# Altium footprint library SpaceVNX.PcbLib: 61 footprints (part 3 of 4)
Each footprint in its own frame and in the unit in brackets; x right, y up, seen from the top. Pads: shape width x height; smd on the part's side, far side on the other; paste and mask are expansions set on the pad; w line width, h text height; cw(c..) or ccw(c..) is an arc to the next point about the centre after c.
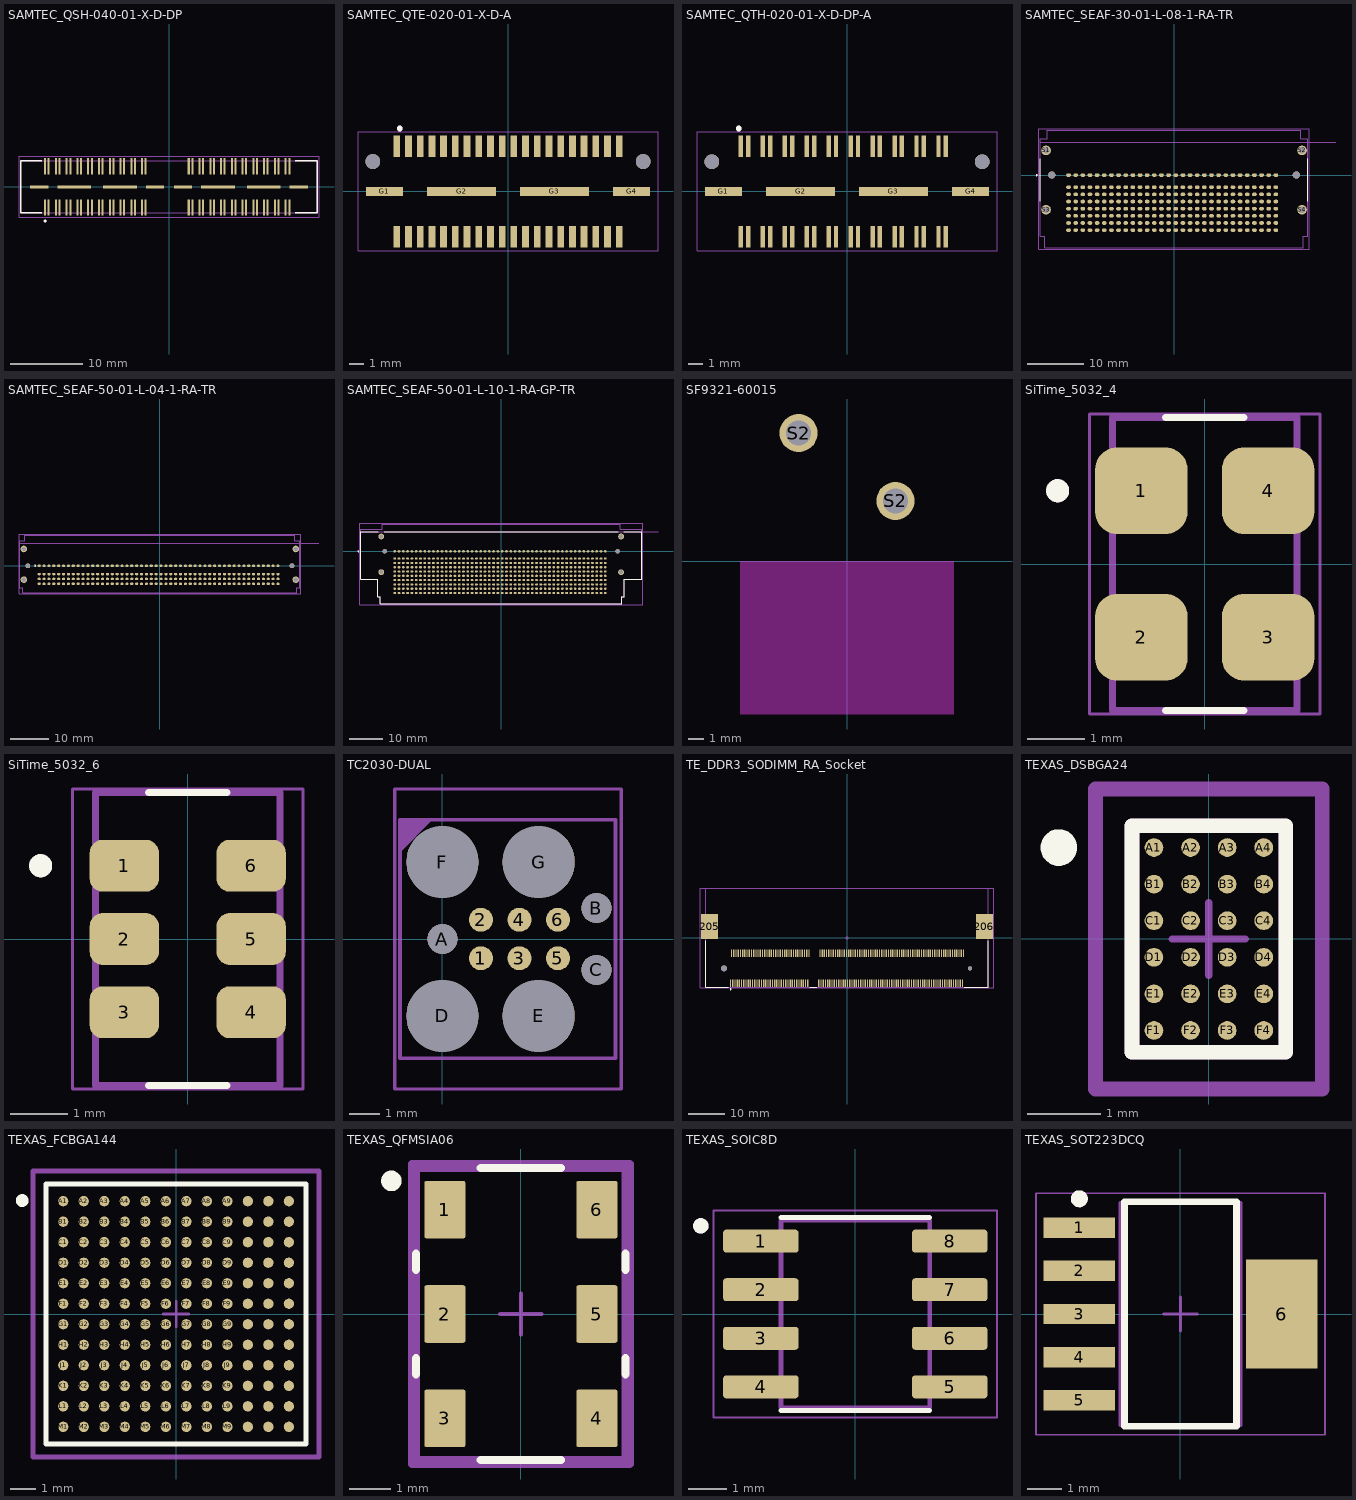
[diagram p2: the footprints below, top view; thin cyan lines are the x and y axes]

## SAMTEC_QSH-040-01-X-D-DP [mm]
pads (88):
  rect 0.28x2.27 smd: 01(-17.25,-2.87) 02(-17.25,2.87) 03(-16.75,-2.87) 04(-16.75,2.87) 05(-15.75,-2.87) 06(-15.75,2.87) 07(-15.25,-2.87) 08(-15.25,2.87) 09(-14.25,-2.87) 10(-14.25,2.87) 11(-13.75,-2.87) 12(-13.75,2.87) 13(-12.75,-2.87) 14(-12.75,2.87) 15(-12.25,-2.87) 16(-12.25,2.87) 17(-11.25,-2.87) 18(-11.25,2.87) 19(-10.75,-2.87) 20(-10.75,2.87) 21(-9.75,-2.87) 22(-9.75,2.87) 23(-9.25,-2.87) 24(-9.25,2.87) 25(-8.25,-2.87) 26(-8.25,2.87) 27(-7.75,-2.87) 28(-7.75,2.87) 29(-6.75,-2.87) 30(-6.75,2.87) 31(-6.25,-2.87) 32(-6.25,2.87) 33(-5.25,-2.87) 34(-5.25,2.87) 35(-4.75,-2.87) 36(-4.75,2.87) 37(-3.75,-2.87) 38(-3.75,2.87) 39(-3.25,-2.87) 40(-3.25,2.87) 41(2.75,-2.87) 42(2.75,2.87) 43(3.25,-2.87) 44(3.25,2.87) 45(4.25,-2.87) 46(4.25,2.87) 47(4.75,-2.87) 48(4.75,2.87) 49(5.75,-2.87) 50(5.75,2.87) 51(6.25,-2.87) 52(6.25,2.87) 53(7.25,-2.87) 54(7.25,2.87) 55(7.75,-2.87) 56(7.75,2.87) 57(8.75,-2.87) 58(8.75,2.87) 59(9.25,-2.87) 60(9.25,2.87) 61(10.25,-2.87) 62(10.25,2.87) 63(10.75,-2.87) 64(10.75,2.87) 65(11.75,-2.87) 66(11.75,2.87) 67(12.25,-2.87) 68(12.25,2.87) 69(13.25,-2.87) 70(13.25,2.87) 71(13.75,-2.87) 72(13.75,2.87) 73(14.75,-2.87) 74(14.75,2.87) 75(15.25,-2.87) 76(15.25,2.87) 77(16.25,-2.87) 78(16.25,2.87) 79(16.75,-2.87) 80(16.75,2.87)
  rect 2.54x0.43 smd: GND1(-18.07,0) GND4(-1.94,0) GND5(1.94,0) GND8(18.07,0)
  rect 4.7x0.43 smd: GND2(-13.18,0) GND3(-6.83,0) GND6(6.83,0) GND7(13.18,0)
Top Overlay:
  circle w0.2: c-17.25,-4.75 r0.1
  lines w0.2: -17.75,-3.62 -20.638,-3.62 -20.638,3.62 -17.75,3.62 ; 17.55,-3.62 20.638,-3.62 20.638,3.62 17.55,3.62
Mechanical 13:
  circle w0.2: c-17.25,-4.75 r0.1
  lines w0.1: -20.638,-3.62 20.638,-3.62 20.638,3.62 -20.638,3.62 -20.638,-3.62
Mechanical 15:
  lines w0.05: -20.888,-4.255 -20.888,4.255 20.888,4.255 20.888,-4.255 -20.888,-4.255
3D body "QSH-040-01-F-D-DP.stp": height 3.05, standoff -0.2, extent -20.656,-3.747 20.657,3.747

## SAMTEC_QTE-020-01-X-D-A [mm]
pads (46):
  rect 0.46x1.45 smd: 01(-7.6,3.09) 02(-7.6,-3.09) 03(-6.8,3.09) 04(-6.8,-3.09) 05(-6,3.09) 06(-6,-3.09) 07(-5.2,3.09) 08(-5.2,-3.09) 09(-4.4,3.09) 10(-4.4,-3.09) 11(-3.6,3.09) 12(-3.6,-3.09) 13(-2.8,3.09) 14(-2.8,-3.09) 15(-2,3.09) 16(-2,-3.09) 17(-1.2,3.09) 18(-1.2,-3.09) 19(-0.4,3.09) 20(-0.4,-3.09) 21(0.4,3.09) 22(0.4,-3.09) 23(1.2,3.09) 24(1.2,-3.09) 25(2,3.09) 26(2,-3.09) 27(2.8,3.09) 28(2.8,-3.09) 29(3.6,3.09) 30(3.6,-3.09) 31(4.4,3.09) 32(4.4,-3.09) 33(5.2,3.09) 34(5.2,-3.09) 35(6,3.09) 36(6,-3.09) 37(6.8,3.09) 38(6.8,-3.09) 39(7.6,3.09) 40(7.6,-3.09)
  rect 2.54x0.64 smd: G1(-8.445,0) G4(8.445,0)
  rect 4.7x0.64 smd: G2(-3.175,0) G3(3.175,0)
  round 1.02 hole 1.02 unplated: ""(-9.24,2.04) ""(9.24,2.04)
Top Overlay:
  circle w0.2: c-7.4,4.3 r0.1
Mechanical 13:
  circle w0.2: c-7.4,4.3 r0.1
Mechanical 15:
  lines w0.05: -10.25,-4.065 10.25,-4.065 10.25,4.065 -10.25,4.065 -10.25,-4.065
3D body "QTE-020-01-C-D-A.stp": height 4.06, standoff -0.91, extent -10.008,-3.556 10.008,3.556

## SAMTEC_QTH-020-01-X-D-DP-A [mm]
pads (46):
  rect 0.3x1.45 smd: 01(-7.25,3.09) 02(-7.25,-3.09) 03(-6.75,3.09) 04(-6.75,-3.09) 05(-5.75,3.09) 06(-5.75,-3.09) 07(-5.25,3.09) 08(-5.25,-3.09) 09(-4.25,3.09) 10(-4.25,-3.09) 11(-3.75,3.09) 12(-3.75,-3.09) 13(-2.75,3.09) 14(-2.75,-3.09) 15(-2.25,3.09) 16(-2.25,-3.09) 17(-1.25,3.09) 18(-1.25,-3.09) 19(-0.75,3.09) 20(-0.75,-3.09) 21(0.25,3.09) 22(0.25,-3.09) 23(0.75,3.09) 24(0.75,-3.09) 25(1.75,3.09) 26(1.75,-3.09) 27(2.25,3.09) 28(2.25,-3.09) 29(3.25,3.09) 30(3.25,-3.09) 31(3.75,3.09) 32(3.75,-3.09) 33(4.75,3.09) 34(4.75,-3.09) 35(5.25,3.09) 36(5.25,-3.09) 37(6.25,3.09) 38(6.25,-3.09) 39(6.75,3.09) 40(6.75,-3.09)
  rect 2.54x0.64 smd: G1(-8.445,0) G4(8.445,0)
  rect 4.7x0.64 smd: G2(-3.175,0) G3(3.175,0)
  round 1.02 hole 1.02 unplated: ""(-9.24,2.03) ""(9.24,2.03)
Top Overlay:
  circle w0.2: c-7.4,4.3 r0.1
Mechanical 13:
  circle w0.2: c-7.4,4.3 r0.1
Mechanical 15:
  lines w0.05: -10.25,-4.065 10.25,-4.065 10.25,4.065 -10.25,4.065 -10.25,-4.065
3D body "QTH-020-01-F-D-DP-A.stp": height 4.06, standoff -0.97, extent -10.007,-3.556 10.008,3.556

## SAMTEC_SEAF-30-01-L-08-1-RA-TR [mm]
pads (246):
  oval 0.84x0.64 smd paste-1: A1(-18.745,0) A2(-17.475,0) A3(-16.205,0) A4(-14.935,0) A5(-13.665,0) A6(-12.395,0) A7(-11.125,0) A8(-9.855,0) A9(-8.585,0) A10(-7.315,0) A11(-6.045,0) A12(-4.775,0) A13(-3.505,0) A14(-2.235,0) A15(-0.965,0) A16(0.305,0) A17(1.575,0) A18(2.845,0) A19(4.115,0) A20(5.385,0) A21(6.655,0) A22(7.925,0) A23(9.195,0) A24(10.465,0) A25(11.735,0) A26(13.005,0) A27(14.275,0) A28(15.545,0) A29(16.815,0) A30(18.085,0) B1(-18.745,-2.16) B2(-17.475,-2.16) B3(-16.205,-2.16) B4(-14.935,-2.16) B5(-13.665,-2.16) B6(-12.395,-2.16) B7(-11.125,-2.16) B8(-9.855,-2.16) B9(-8.585,-2.16) B10(-7.315,-2.16) B11(-6.045,-2.16) B12(-4.775,-2.16) B13(-3.505,-2.16) B14(-2.235,-2.16) B15(-0.965,-2.16) B16(0.305,-2.16) B17(1.575,-2.16) B18(2.845,-2.16) B19(4.115,-2.16) B20(5.385,-2.16) B21(6.655,-2.16) B22(7.925,-2.16) B23(9.195,-2.16) B24(10.465,-2.16) B25(11.735,-2.16) B26(13.005,-2.16) B27(14.275,-2.16) B28(15.545,-2.16) B29(16.815,-2.16) B30(18.085,-2.16) C1(-18.745,-3.43) C2(-17.475,-3.43) C3(-16.205,-3.43) C4(-14.935,-3.43) C5(-13.665,-3.43) C6(-12.395,-3.43) C7(-11.125,-3.43) C8(-9.855,-3.43) C9(-8.585,-3.43) C10(-7.315,-3.43) C11(-6.045,-3.43) C12(-4.775,-3.43) C13(-3.505,-3.43) C14(-2.235,-3.43) C15(-0.965,-3.43) C16(0.305,-3.43) C17(1.575,-3.43) C18(2.845,-3.43) C19(4.115,-3.43) C20(5.385,-3.43) C21(6.655,-3.43) C22(7.925,-3.43) C23(9.195,-3.43) C24(10.465,-3.43) C25(11.735,-3.43) C26(13.005,-3.43) C27(14.275,-3.43) C28(15.545,-3.43) C29(16.815,-3.43) C30(18.085,-3.43) D1(-18.745,-4.7) D2(-17.475,-4.7) D3(-16.205,-4.7) D4(-14.935,-4.7) D5(-13.665,-4.7) D6(-12.395,-4.7) D7(-11.125,-4.7) D8(-9.855,-4.7) D9(-8.585,-4.7) D10(-7.315,-4.7) D11(-6.045,-4.7) D12(-4.775,-4.7) D13(-3.505,-4.7) D14(-2.235,-4.7) D15(-0.965,-4.7) D16(0.305,-4.7) D17(1.575,-4.7) D18(2.845,-4.7) D19(4.115,-4.7) D20(5.385,-4.7) D21(6.655,-4.7) D22(7.925,-4.7) D23(9.195,-4.7) D24(10.465,-4.7) D25(11.735,-4.7) D26(13.005,-4.7) D27(14.275,-4.7) D28(15.545,-4.7) D29(16.815,-4.7) D30(18.085,-4.7) E1(-18.745,-5.97) E2(-17.475,-5.97) E3(-16.205,-5.97) E4(-14.935,-5.97) E5(-13.665,-5.97) E6(-12.395,-5.97) E7(-11.125,-5.97) E8(-9.855,-5.97) E9(-8.585,-5.97) E10(-7.315,-5.97) E11(-6.045,-5.97) E12(-4.775,-5.97) E13(-3.505,-5.97) E14(-2.235,-5.97) E15(-0.965,-5.97) E16(0.305,-5.97) E17(1.575,-5.97) E18(2.845,-5.97) E19(4.115,-5.97) E20(5.385,-5.97) E21(6.655,-5.97) E22(7.925,-5.97) E23(9.195,-5.97) E24(10.465,-5.97) E25(11.735,-5.97) E26(13.005,-5.97) E27(14.275,-5.97) E28(15.545,-5.97) E29(16.815,-5.97) E30(18.085,-5.97) F1(-18.745,-7.24) F2(-17.475,-7.24) F3(-16.205,-7.24) F4(-14.935,-7.24) F5(-13.665,-7.24) F6(-12.395,-7.24) F7(-11.125,-7.24) F8(-9.855,-7.24) F9(-8.585,-7.24) F10(-7.315,-7.24) F11(-6.045,-7.24) F12(-4.775,-7.24) F13(-3.505,-7.24) F14(-2.235,-7.24) F15(-0.965,-7.24) F16(0.305,-7.24) F17(1.575,-7.24) F18(2.845,-7.24) F19(4.115,-7.24) F20(5.385,-7.24) F21(6.655,-7.24) F22(7.925,-7.24) F23(9.195,-7.24) F24(10.465,-7.24) F25(11.735,-7.24) F26(13.005,-7.24) F27(14.275,-7.24) F28(15.545,-7.24) F29(16.815,-7.24) F30(18.085,-7.24) G1(-18.745,-8.51) G2(-17.475,-8.51) G3(-16.205,-8.51) G4(-14.935,-8.51) G5(-13.665,-8.51) G6(-12.395,-8.51) G7(-11.125,-8.51) G8(-9.855,-8.51) G9(-8.585,-8.51) G10(-7.315,-8.51) G11(-6.045,-8.51) G12(-4.775,-8.51) G13(-3.505,-8.51) G14(-2.235,-8.51) G15(-0.965,-8.51) G16(0.305,-8.51) G17(1.575,-8.51) G18(2.845,-8.51) G19(4.115,-8.51) G20(5.385,-8.51) G21(6.655,-8.51) G22(7.925,-8.51) G23(9.195,-8.51) G24(10.465,-8.51) G25(11.735,-8.51) G26(13.005,-8.51) G27(14.275,-8.51) G28(15.545,-8.51) G29(16.815,-8.51) G30(18.085,-8.51) H1(-18.745,-9.78) H2(-17.475,-9.78) H3(-16.205,-9.78) H4(-14.935,-9.78) H5(-13.665,-9.78) H6(-12.395,-9.78) H7(-11.125,-9.78) H8(-9.855,-9.78) H9(-8.585,-9.78) H10(-7.315,-9.78) H11(-6.045,-9.78) H12(-4.775,-9.78) H13(-3.505,-9.78) H14(-2.235,-9.78) H15(-0.965,-9.78) H16(0.305,-9.78) H17(1.575,-9.78) H18(2.845,-9.78) H19(4.115,-9.78) H20(5.385,-9.78) H21(6.655,-9.78) H22(7.925,-9.78) H23(9.195,-9.78) H24(10.465,-9.78) H25(11.735,-9.78) H26(13.005,-9.78) H27(14.275,-9.78) H28(15.545,-9.78) H29(16.815,-9.78) H30(18.085,-9.78)
  round 1.71 hole 1.14: S1(-22.735,4.38) S2(22.735,4.38) S3(-22.735,-6.16) S4(22.735,-6.16)
  round 1.27 hole 1.27 unplated: ""(-21.715,0) ""(21.715,0)
Top Overlay:
  circle w0.2: c-24.42,0 r0.1
  lines w0.2: -23.75,-4.68 -23.75,2.9 ; 23.75,-4.68 23.75,2.9
Top Paste:
  drawing of 245 lines, arcs and shapes, not listed
Mechanical 13:
  circle w0.2: c-24.42,0 r0.1
  lines w0.1: 28.77,5.84 23.75,5.84 ; -23.75,5.84 -23.75,-10.86 -22.985,-10.86 -22.985,-12.94 22.985,-12.94 22.985,-10.86 23.75,-10.86 23.75,5.84 ; -23.75,5.84 23.75,5.84 ; -23.75,5.84 -23.75,6.49 -22.48,6.49 -22.48,7.99 22.48,7.99 22.48,6.49 23.75,6.49 23.75,5.84
  text "PCB EDGE" at -22,6.49 h1.02
Mechanical 15:
  lines w0.05: -24,-13.19 24,-13.19 24,8.24 -24,8.24 -24,-13.19
3D body "SEAF-30-01-L-08-1-RA-TR.stp": height 12.91, standoff -1.59, extent -23.749,-12.471 23.749,7.988

## SAMTEC_SEAF-50-01-L-04-1-RA-TR [mm]
pads (206):
  oval 0.84x0.64 smd paste-1: A1(-31.445,0) A2(-30.175,0) A3(-28.905,0) A4(-27.635,0) A5(-26.365,0) A6(-25.095,0) A7(-23.825,0) A8(-22.555,0) A9(-21.285,0) A10(-20.015,0) A11(-18.745,0) A12(-17.475,0) A13(-16.205,0) A14(-14.935,0) A15(-13.665,0) A16(-12.395,0) A17(-11.125,0) A18(-9.855,0) A19(-8.585,0) A20(-7.315,0) A21(-6.045,0) A22(-4.775,0) A23(-3.505,0) A24(-2.235,0) A25(-0.965,0) A26(0.305,0) A27(1.575,0) A28(2.845,0) A29(4.115,0) A30(5.385,0) A31(6.655,0) A32(7.925,0) A33(9.195,0) A34(10.465,0) A35(11.735,0) A36(13.005,0) A37(14.275,0) A38(15.545,0) A39(16.815,0) A40(18.085,0) A41(19.355,0) A42(20.625,0) A43(21.895,0) A44(23.165,0) A45(24.435,0) A46(25.705,0) A47(26.975,0) A48(28.245,0) A49(29.515,0) A50(30.785,0) B1(-31.445,-2.16) B2(-30.175,-2.16) B3(-28.905,-2.16) B4(-27.635,-2.16) B5(-26.365,-2.16) B6(-25.095,-2.16) B7(-23.825,-2.16) B8(-22.555,-2.16) B9(-21.285,-2.16) B10(-20.015,-2.16) B11(-18.745,-2.16) B12(-17.475,-2.16) B13(-16.205,-2.16) B14(-14.935,-2.16) B15(-13.665,-2.16) B16(-12.395,-2.16) B17(-11.125,-2.16) B18(-9.855,-2.16) B19(-8.585,-2.16) B20(-7.315,-2.16) B21(-6.045,-2.16) B22(-4.775,-2.16) B23(-3.505,-2.16) B24(-2.235,-2.16) B25(-0.965,-2.16) B26(0.305,-2.16) B27(1.575,-2.16) B28(2.845,-2.16) B29(4.115,-2.16) B30(5.385,-2.16) B31(6.655,-2.16) B32(7.925,-2.16) B33(9.195,-2.16) B34(10.465,-2.16) B35(11.735,-2.16) B36(13.005,-2.16) B37(14.275,-2.16) B38(15.545,-2.16) B39(16.815,-2.16) B40(18.085,-2.16) B41(19.355,-2.16) B42(20.625,-2.16) B43(21.895,-2.16) B44(23.165,-2.16) B45(24.435,-2.16) B46(25.705,-2.16) B47(26.975,-2.16) B48(28.245,-2.16) B49(29.515,-2.16) B50(30.785,-2.16) C1(-31.445,-3.43) C2(-30.175,-3.43) C3(-28.905,-3.43) C4(-27.635,-3.43) C5(-26.365,-3.43) C6(-25.095,-3.43) C7(-23.825,-3.43) C8(-22.555,-3.43) C9(-21.285,-3.43) C10(-20.015,-3.43) C11(-18.745,-3.43) C12(-17.475,-3.43) C13(-16.205,-3.43) C14(-14.935,-3.43) C15(-13.665,-3.43) C16(-12.395,-3.43) C17(-11.125,-3.43) C18(-9.855,-3.43) C19(-8.585,-3.43) C20(-7.315,-3.43) C21(-6.045,-3.43) C22(-4.775,-3.43) C23(-3.505,-3.43) C24(-2.235,-3.43) C25(-0.965,-3.43) C26(0.305,-3.43) C27(1.575,-3.43) C28(2.845,-3.43) C29(4.115,-3.43) C30(5.385,-3.43) C31(6.655,-3.43) C32(7.925,-3.43) C33(9.195,-3.43) C34(10.465,-3.43) C35(11.735,-3.43) C36(13.005,-3.43) C37(14.275,-3.43) C38(15.545,-3.43) C39(16.815,-3.43) C40(18.085,-3.43) C41(19.355,-3.43) C42(20.625,-3.43) C43(21.895,-3.43) C44(23.165,-3.43) C45(24.435,-3.43) C46(25.705,-3.43) C47(26.975,-3.43) C48(28.245,-3.43) C49(29.515,-3.43) C50(30.785,-3.43) D1(-31.445,-4.7) D2(-30.175,-4.7) D3(-28.905,-4.7) D4(-27.635,-4.7) D5(-26.365,-4.7) D6(-25.095,-4.7) D7(-23.825,-4.7) D8(-22.555,-4.7) D9(-21.285,-4.7) D10(-20.015,-4.7) D11(-18.745,-4.7) D12(-17.475,-4.7) D13(-16.205,-4.7) D14(-14.935,-4.7) D15(-13.665,-4.7) D16(-12.395,-4.7) D17(-11.125,-4.7) D18(-9.855,-4.7) D19(-8.585,-4.7) D20(-7.315,-4.7) D21(-6.045,-4.7) D22(-4.775,-4.7) D23(-3.505,-4.7) D24(-2.235,-4.7) D25(-0.965,-4.7) D26(0.305,-4.7) D27(1.575,-4.7) D28(2.845,-4.7) D29(4.115,-4.7) D30(5.385,-4.7) D31(6.655,-4.7) D32(7.925,-4.7) D33(9.195,-4.7) D34(10.465,-4.7) D35(11.735,-4.7) D36(13.005,-4.7) D37(14.275,-4.7) D38(15.545,-4.7) D39(16.815,-4.7) D40(18.085,-4.7) D41(19.355,-4.7) D42(20.625,-4.7) D43(21.895,-4.7) D44(23.165,-4.7) D45(24.435,-4.7) D46(25.705,-4.7) D47(26.975,-4.7) D48(28.245,-4.7) D49(29.515,-4.7) D50(30.785,-4.7)
  round 1.71 hole 1.14: S1(-35.435,4.38) S2(35.435,4.38) S3(-35.435,-3.62) S4(35.435,-3.62)
  round 1.27 hole 1.27 unplated: ""(-34.415,0) ""(34.415,0)
Top Overlay:
  circle w0.2: c-32.5,0 r0.1
Top Paste:
  drawing of 204 lines, arcs and shapes, not listed
Mechanical 13:
  circle w0.2: c-32.5,0 r0.1
  lines w0.1: 41.47,5.84 -36.45,5.84 ; -36.45,5.84 -36.45,-5.78 -35.685,-5.78 -35.685,-7.05 35.685,-7.05 35.685,-5.78 36.45,-5.78 36.45,6.49 35.18,6.49 35.18,7.99 -35.18,7.99 -35.18,6.49 -36.45,6.49 -36.45,5.84
  text "PCB EDGE" at 36.92,6 h0.61
Mechanical 15:
  lines w0.05: -36.7,-7.3 -36.7,8.24 36.7,8.24 36.7,-7.3 -36.7,-7.3
3D body "SEAF-50-01-L-04-1-RA-TR.stp": height 7.82, standoff -1.6, extent -36.449,-7.036 36.449,7.988

## SAMTEC_SEAF-50-01-L-10-1-RA-GP-TR [mm] "High-Speed Right-Angled Open-Pin-Field Array Socket"
pads (506):
  oval 0.84x0.64 smd paste-1: A1(-31.445,0) A2(-30.175,0) A3(-28.905,0) A4(-27.635,0) A5(-26.365,0) A6(-25.095,0) A7(-23.825,0) A8(-22.555,0) A9(-21.285,0) A10(-20.015,0) A11(-18.745,0) A12(-17.475,0) A13(-16.205,0) A14(-14.935,0) A15(-13.665,0) A16(-12.395,0) A17(-11.125,0) A18(-9.855,0) A19(-8.585,0) A20(-7.315,0) A21(-6.045,0) A22(-4.775,0) A23(-3.505,0) A24(-2.235,0) A25(-0.965,0) A26(0.305,0) A27(1.575,0) A28(2.845,0) A29(4.115,0) A30(5.385,0) A31(6.655,0) A32(7.925,0) A33(9.195,0) A34(10.465,0) A35(11.735,0) A36(13.005,0) A37(14.275,0) A38(15.545,0) A39(16.815,0) A40(18.085,0) A41(19.355,0) A42(20.625,0) A43(21.895,0) A44(23.165,0) A45(24.435,0) A46(25.705,0) A47(26.975,0) A48(28.245,0) A49(29.515,0) A50(30.785,0) B1(-31.445,-2.16) B2(-30.175,-2.16) B3(-28.905,-2.16) B4(-27.635,-2.16) B5(-26.365,-2.16) B6(-25.095,-2.16) B7(-23.825,-2.16) B8(-22.555,-2.16) B9(-21.285,-2.16) B10(-20.015,-2.16) B11(-18.745,-2.16) B12(-17.475,-2.16) B13(-16.205,-2.16) B14(-14.935,-2.16) B15(-13.665,-2.16) B16(-12.395,-2.16) B17(-11.125,-2.16) B18(-9.855,-2.16) B19(-8.585,-2.16) B20(-7.315,-2.16) B21(-6.045,-2.16) B22(-4.775,-2.16) B23(-3.505,-2.16) B24(-2.235,-2.16) B25(-0.965,-2.16) B26(0.305,-2.16) B27(1.575,-2.16) B28(2.845,-2.16) B29(4.115,-2.16) B30(5.385,-2.16) B31(6.655,-2.16) B32(7.925,-2.16) B33(9.195,-2.16) B34(10.465,-2.16) B35(11.735,-2.16) B36(13.005,-2.16) B37(14.275,-2.16) B38(15.545,-2.16) B39(16.815,-2.16) B40(18.085,-2.16) B41(19.355,-2.16) B42(20.625,-2.16) B43(21.895,-2.16) B44(23.165,-2.16) B45(24.435,-2.16) B46(25.705,-2.16) B47(26.975,-2.16) B48(28.245,-2.16) B49(29.515,-2.16) B50(30.785,-2.16) C1(-31.445,-3.43) C2(-30.175,-3.43) C3(-28.905,-3.43) C4(-27.635,-3.43) C5(-26.365,-3.43) C6(-25.095,-3.43) C7(-23.825,-3.43) C8(-22.555,-3.43) C9(-21.285,-3.43) C10(-20.015,-3.43) C11(-18.745,-3.43) C12(-17.475,-3.43) C13(-16.205,-3.43) C14(-14.935,-3.43) C15(-13.665,-3.43) C16(-12.395,-3.43) C17(-11.125,-3.43) C18(-9.855,-3.43) C19(-8.585,-3.43) C20(-7.315,-3.43) C21(-6.045,-3.43) C22(-4.775,-3.43) C23(-3.505,-3.43) C24(-2.235,-3.43) C25(-0.965,-3.43) C26(0.305,-3.43) C27(1.575,-3.43) C28(2.845,-3.43) C29(4.115,-3.43) C30(5.385,-3.43) C31(6.655,-3.43) C32(7.925,-3.43) C33(9.195,-3.43) C34(10.465,-3.43) C35(11.735,-3.43) C36(13.005,-3.43) C37(14.275,-3.43) C38(15.545,-3.43) C39(16.815,-3.43) C40(18.085,-3.43) C41(19.355,-3.43) C42(20.625,-3.43) C43(21.895,-3.43) C44(23.165,-3.43) C45(24.435,-3.43) C46(25.705,-3.43) C47(26.975,-3.43) C48(28.245,-3.43) C49(29.515,-3.43) C50(30.785,-3.43) D1(-31.445,-4.7) D2(-30.175,-4.7) D3(-28.905,-4.7) D4(-27.635,-4.7) D5(-26.365,-4.7) D6(-25.095,-4.7) D7(-23.825,-4.7) D8(-22.555,-4.7) D9(-21.285,-4.7) D10(-20.015,-4.7) D11(-18.745,-4.7) D12(-17.475,-4.7) D13(-16.205,-4.7) D14(-14.935,-4.7) D15(-13.665,-4.7) D16(-12.395,-4.7) D17(-11.125,-4.7) D18(-9.855,-4.7) D19(-8.585,-4.7) D20(-7.315,-4.7) D21(-6.045,-4.7) D22(-4.775,-4.7) D23(-3.505,-4.7) D24(-2.235,-4.7) D25(-0.965,-4.7) D26(0.305,-4.7) D27(1.575,-4.7) D28(2.845,-4.7) D29(4.115,-4.7) D30(5.385,-4.7) D31(6.655,-4.7) D32(7.925,-4.7) D33(9.195,-4.7) D34(10.465,-4.7) D35(11.735,-4.7) D36(13.005,-4.7) D37(14.275,-4.7) D38(15.545,-4.7) D39(16.815,-4.7) D40(18.085,-4.7) D41(19.355,-4.7) D42(20.625,-4.7) D43(21.895,-4.7) D44(23.165,-4.7) D45(24.435,-4.7) D46(25.705,-4.7) D47(26.975,-4.7) D48(28.245,-4.7) D49(29.515,-4.7) D50(30.785,-4.7) E1(-31.445,-5.97) E2(-30.175,-5.97) E3(-28.905,-5.97) E4(-27.635,-5.97) E5(-26.365,-5.97) E6(-25.095,-5.97) E7(-23.825,-5.97) E8(-22.555,-5.97) E9(-21.285,-5.97) E10(-20.015,-5.97) E11(-18.745,-5.97) E12(-17.475,-5.97) E13(-16.205,-5.97) E14(-14.935,-5.97) E15(-13.665,-5.97) E16(-12.395,-5.97) E17(-11.125,-5.97) E18(-9.855,-5.97) E19(-8.585,-5.97) E20(-7.315,-5.97) E21(-6.045,-5.97) E22(-4.775,-5.97) E23(-3.505,-5.97) E24(-2.235,-5.97) E25(-0.965,-5.97) E26(0.305,-5.97) E27(1.575,-5.97) E28(2.845,-5.97) E29(4.115,-5.97) E30(5.385,-5.97) E31(6.655,-5.97) E32(7.925,-5.97) E33(9.195,-5.97) E34(10.465,-5.97) E35(11.735,-5.97) E36(13.005,-5.97) E37(14.275,-5.97) E38(15.545,-5.97) E39(16.815,-5.97) E40(18.085,-5.97) E41(19.355,-5.97) E42(20.625,-5.97) E43(21.895,-5.97) E44(23.165,-5.97) E45(24.435,-5.97) E46(25.705,-5.97) E47(26.975,-5.97) E48(28.245,-5.97) E49(29.515,-5.97) E50(30.785,-5.97) F1(-31.445,-7.24) F2(-30.175,-7.24) F3(-28.905,-7.24) F4(-27.635,-7.24) F5(-26.365,-7.24) F6(-25.095,-7.24) F7(-23.825,-7.24) F8(-22.555,-7.24) F9(-21.285,-7.24) F10(-20.015,-7.24) F11(-18.745,-7.24) F12(-17.475,-7.24) F13(-16.205,-7.24) F14(-14.935,-7.24) F15(-13.665,-7.24) F16(-12.395,-7.24) F17(-11.125,-7.24) F18(-9.855,-7.24) F19(-8.585,-7.24) F20(-7.315,-7.24) F21(-6.045,-7.24) F22(-4.775,-7.24) F23(-3.505,-7.24) F24(-2.235,-7.24) F25(-0.965,-7.24) F26(0.305,-7.24) F27(1.575,-7.24) F28(2.845,-7.24) F29(4.115,-7.24) F30(5.385,-7.24) F31(6.655,-7.24) F32(7.925,-7.24) F33(9.195,-7.24) F34(10.465,-7.24) F35(11.735,-7.24) F36(13.005,-7.24) F37(14.275,-7.24) F38(15.545,-7.24) F39(16.815,-7.24) F40(18.085,-7.24) F41(19.355,-7.24) F42(20.625,-7.24) F43(21.895,-7.24) F44(23.165,-7.24) F45(24.435,-7.24) F46(25.705,-7.24) F47(26.975,-7.24) F48(28.245,-7.24) F49(29.515,-7.24) F50(30.785,-7.24) G1(-31.445,-8.51) G2(-30.175,-8.51) G3(-28.905,-8.51) G4(-27.635,-8.51) G5(-26.365,-8.51) G6(-25.095,-8.51) G7(-23.825,-8.51) G8(-22.555,-8.51) G9(-21.285,-8.51) G10(-20.015,-8.51) G11(-18.745,-8.51) G12(-17.475,-8.51) G13(-16.205,-8.51) G14(-14.935,-8.51) G15(-13.665,-8.51) G16(-12.395,-8.51) G17(-11.125,-8.51) G18(-9.855,-8.51) G19(-8.585,-8.51) G20(-7.315,-8.51) G21(-6.045,-8.51) G22(-4.775,-8.51) G23(-3.505,-8.51) G24(-2.235,-8.51) G25(-0.965,-8.51) G26(0.305,-8.51) G27(1.575,-8.51) G28(2.845,-8.51) G29(4.115,-8.51) G30(5.385,-8.51) G31(6.655,-8.51) G32(7.925,-8.51) G33(9.195,-8.51) G34(10.465,-8.51) G35(11.735,-8.51) G36(13.005,-8.51) G37(14.275,-8.51) G38(15.545,-8.51) G39(16.815,-8.51) G40(18.085,-8.51) G41(19.355,-8.51) G42(20.625,-8.51) G43(21.895,-8.51) G44(23.165,-8.51) G45(24.435,-8.51) G46(25.705,-8.51) G47(26.975,-8.51) G48(28.245,-8.51) G49(29.515,-8.51) G50(30.785,-8.51) H1(-31.445,-9.78) H2(-30.175,-9.78) H3(-28.905,-9.78) H4(-27.635,-9.78) H5(-26.365,-9.78) H6(-25.095,-9.78) H7(-23.825,-9.78) H8(-22.555,-9.78) H9(-21.285,-9.78) H10(-20.015,-9.78) H11(-18.745,-9.78) H12(-17.475,-9.78) H13(-16.205,-9.78) H14(-14.935,-9.78) H15(-13.665,-9.78) H16(-12.395,-9.78) H17(-11.125,-9.78) H18(-9.855,-9.78) H19(-8.585,-9.78) H20(-7.315,-9.78) H21(-6.045,-9.78) H22(-4.775,-9.78) H23(-3.505,-9.78) H24(-2.235,-9.78) H25(-0.965,-9.78) H26(0.305,-9.78) H27(1.575,-9.78) H28(2.845,-9.78) H29(4.115,-9.78) H30(5.385,-9.78) H31(6.655,-9.78) H32(7.925,-9.78) H33(9.195,-9.78) H34(10.465,-9.78) H35(11.735,-9.78) H36(13.005,-9.78) H37(14.275,-9.78) H38(15.545,-9.78) H39(16.815,-9.78) H40(18.085,-9.78) H41(19.355,-9.78) H42(20.625,-9.78) H43(21.895,-9.78) H44(23.165,-9.78) H45(24.435,-9.78) H46(25.705,-9.78) H47(26.975,-9.78) H48(28.245,-9.78) H49(29.515,-9.78) H50(30.785,-9.78) I1(-31.445,-11.05) I2(-30.175,-11.05) I3(-28.905,-11.05) I4(-27.635,-11.05) I5(-26.365,-11.05) I6(-25.095,-11.05) I7(-23.825,-11.05) I8(-22.555,-11.05) I9(-21.285,-11.05) I10(-20.015,-11.05) I11(-18.745,-11.05) I12(-17.475,-11.05) I13(-16.205,-11.05) I14(-14.935,-11.05) I15(-13.665,-11.05) I16(-12.395,-11.05) I17(-11.125,-11.05) I18(-9.855,-11.05) I19(-8.585,-11.05) I20(-7.315,-11.05) I21(-6.045,-11.05) I22(-4.775,-11.05) I23(-3.505,-11.05) I24(-2.235,-11.05) I25(-0.965,-11.05) I26(0.305,-11.05) I27(1.575,-11.05) I28(2.845,-11.05) I29(4.115,-11.05) I30(5.385,-11.05) I31(6.655,-11.05) I32(7.925,-11.05) I33(9.195,-11.05) I34(10.465,-11.05) I35(11.735,-11.05) I36(13.005,-11.05) I37(14.275,-11.05) I38(15.545,-11.05) I39(16.815,-11.05) I40(18.085,-11.05) I41(19.355,-11.05) I42(20.625,-11.05) I43(21.895,-11.05) I44(23.165,-11.05) I45(24.435,-11.05) I46(25.705,-11.05) I47(26.975,-11.05) I48(28.245,-11.05) I49(29.515,-11.05) I50(30.785,-11.05) J1(-31.445,-12.32) J2(-30.175,-12.32) J3(-28.905,-12.32) J4(-27.635,-12.32) J5(-26.365,-12.32) J6(-25.095,-12.32) J7(-23.825,-12.32) J8(-22.555,-12.32) J9(-21.285,-12.32) J10(-20.015,-12.32) J11(-18.745,-12.32) J12(-17.475,-12.32) J13(-16.205,-12.32) J14(-14.935,-12.32) J15(-13.665,-12.32) J16(-12.395,-12.32) J17(-11.125,-12.32) J18(-9.855,-12.32) J19(-8.585,-12.32) J20(-7.315,-12.32) J21(-6.045,-12.32) J22(-4.775,-12.32) J23(-3.505,-12.32) J24(-2.235,-12.32) J25(-0.965,-12.32) J26(0.305,-12.32) J27(1.575,-12.32) J28(2.845,-12.32) J29(4.115,-12.32) J30(5.385,-12.32) J31(6.655,-12.32) J32(7.925,-12.32) J33(9.195,-12.32) J34(10.465,-12.32) J35(11.735,-12.32) J36(13.005,-12.32) J37(14.275,-12.32) J38(15.545,-12.32) J39(16.815,-12.32) J40(18.085,-12.32) J41(19.355,-12.32) J42(20.625,-12.32) J43(21.895,-12.32) J44(23.165,-12.32) J45(24.435,-12.32) J46(25.705,-12.32) J47(26.975,-12.32) J48(28.245,-12.32) J49(29.515,-12.32) J50(30.785,-12.32)
  round 1.71 hole 1.14: S1(-35.435,4.38) S2(35.435,4.38) S3(-35.435,-6.16) S4(35.435,-6.16)
  round 1.27 hole 1.27 unplated: ""(-34.415,0) ""(34.415,0)
Top Overlay:
  circle w0.2: c-42.2,0 r0.1
  lines w0.2: -36.3,5.84 -41.53,5.84 -41.53,-8.32 -36.45,-8.32 -36.45,-13.4 -35.685,-13.4 -35.685,-15.48 35.685,-15.48 35.685,-13.4 36.45,-13.4 36.45,-8.32 41.53,-8.32 41.53,5.84 36.3,5.84 ; -34.55,5.84 34.55,5.84
Top Paste:
  drawing of 504 lines, arcs and shapes, not listed
Mechanical 13:
  circle w0.2: c-42.2,0 r0.1
  lines w0.1: 46.35,5.84 41.53,5.84 ; -41.53,5.84 41.53,5.84 ; -41.53,5.84 -41.53,6.49 -35.18,6.49 -35.18,7.99 35.18,7.99 35.18,6.49 41.53,6.49 41.53,5.84 ; -41.53,5.84 -41.53,-8.32 -36.45,-8.32 -36.45,-13.4 -35.685,-13.4 -35.685,-15.48 35.685,-15.48 35.685,-13.4 36.45,-13.4 36.45,-8.32 41.53,-8.32 41.53,5.84
  text "PCB EDGE" at 42.35,6 h1.27
Mechanical 15:
  lines w0.05: -41.78,-15.73 41.78,-15.73 41.78,8.24 -41.78,8.24 -41.78,-15.73
3D body "SEAF-50-01-L-10-1-RA-GP-TR.stp": height 14.63, standoff -2.41, extent -41.529,-15.011 41.529,7.988

## SF9321-60015 [mm]
pads (2):
  round 2.5 hole 1.65: S2(-3.175,8.42) S2(3.175,3.97)
Keep-Out Layer:
  board cut-out: -7,-10 -7,0 7,0 7,-10
3D body "SF9321-60015_CAD.step": height 14.91, standoff -2.42, extent -6.96,-10 6.96,11.59

## SiTime_5032_4 [mm] "5.0 x 3.2 mm 4 Pin"
pads (4):
  rrect50% 1.6x1.5 smd: 1(-1.1,1.27) 2(-1.1,-1.27) 3(1.1,-1.27) 4(1.1,1.27)
Top Overlay:
  circle w0.2: c-2.55,1.27 r0.1
  lines w0.127: -0.68,-2.54 0.68,-2.54 ; -0.68,2.54 0.68,2.54
Mechanical 13:
  circle w0.2: c-2.55,1.27 r0.1
  lines w0.127: -1.6,-2.54 -1.6,2.54 1.6,2.54 1.6,-2.54 -1.6,-2.54
Mechanical 15:
  lines w0.05: -2,-2.6 -2,2.6 2,2.6 2,-2.6 -2,-2.6
3D body "QFN_5032_4pins.stp": height 0.75, standoff -0.08, extent -1.6,-2.5 1.6,2.5

## SiTime_5032_6 [mm] "5.0 x 3.2 mm 6 Pin"
pads (6):
  rrect50% 1.2x0.9 smd: 1(-1.1,1.27) 2(-1.1,0) 3(-1.1,-1.27) 4(1.1,-1.27) 5(1.1,0) 6(1.1,1.27)
Top Overlay:
  circle w0.2: c-2.55,1.27 r0.1
  lines w0.127: -0.68,-2.54 0.68,-2.54 ; -0.68,2.54 0.68,2.54
Mechanical 13:
  circle w0.2: c-2.55,1.27 r0.1
  lines w0.127: -1.6,-2.54 -1.6,2.54 1.6,2.54 1.6,-2.54 -1.6,-2.54
Mechanical 15:
  lines w0.05: -2,-2.6 -2,2.6 2,2.6 2,-2.6 -2,-2.6
3D body "QFN_5032_6pins.stp": height 0.8, standoff -0.05, extent -1.6,-2.5 1.6,2.5

## TC2030-DUAL [mil]
pads (13):
  round 31 smd paste-393.7: 1(50,-25) 2(50,25) 3(100,-25) 4(100,25) 5(150,-25) 6(150,25)
  round 39 hole 39 unplated: A(0,0) B(200,40) C(200,-40)
  round 93.5 hole 93.5 unplated: D(0,-100) E(125,-100) F(0,100) G(125,100)
Mechanical 15:
  lines w3.94: -62.01,-194.88 -62.01,194.88 232.28,194.88 232.28,-194.88 -62.01,-194.88
Mechanical 29:
  lines w5: -55,-155 225,-155 225,155 -55,155 -55,-155
  text ".Designator" at 14.55,-22 h50
Mechanical 30:
  region: -55,155 -13,155 -55,113
  lines w5: -55,-155 225,-155 225,155 -55,155 -55,-155

## TE_DDR3_SODIMM_RA_Socket [mm] "Connector SODIMM Socket 204 POS 0.6mm Solder RA SMD Embossed"
pads (208):
  rect 0.35x2 smd paste+0 mask+0: 1(-31.65,-12.35) 2(-31.35,-4.15) 3(-31.05,-12.35) 4(-30.75,-4.15) 5(-30.45,-12.35) 6(-30.15,-4.15) 7(-29.85,-12.35) 8(-29.55,-4.15) 9(-29.25,-12.35) 10(-28.95,-4.15) 11(-28.65,-12.35) 12(-28.35,-4.15) 13(-28.05,-12.35) 14(-27.75,-4.15) 15(-27.45,-12.35) 16(-27.15,-4.15) 17(-26.85,-12.35) 18(-26.55,-4.15) 19(-26.25,-12.35) 20(-25.95,-4.15) 21(-25.65,-12.35) 22(-25.35,-4.15) 23(-25.05,-12.35) 24(-24.75,-4.15) 25(-24.45,-12.35) 26(-24.15,-4.15) 27(-23.85,-12.35) 28(-23.55,-4.15) 29(-23.25,-12.35) 30(-22.95,-4.15) 31(-22.65,-12.35) 32(-22.35,-4.15) 33(-22.05,-12.35) 34(-21.75,-4.15) 35(-21.45,-12.35) 36(-21.15,-4.15) 37(-20.85,-12.35) 38(-20.55,-4.15) 39(-20.25,-12.35) 40(-19.95,-4.15) 41(-19.65,-12.35) 42(-19.35,-4.15) 43(-19.05,-12.35) 44(-18.75,-4.15) 45(-18.45,-12.35) 46(-18.15,-4.15) 47(-17.85,-12.35) 48(-17.55,-4.15) 49(-17.25,-12.35) 50(-16.95,-4.15) 51(-16.65,-12.35) 52(-16.35,-4.15) 53(-16.05,-12.35) 54(-15.75,-4.15) 55(-15.45,-12.35) 56(-15.15,-4.15) 57(-14.85,-12.35) 58(-14.55,-4.15) 59(-14.25,-12.35) 60(-13.95,-4.15) 61(-13.65,-12.35) 62(-13.35,-4.15) 63(-13.05,-12.35) 64(-12.75,-4.15) 65(-12.45,-12.35) 66(-12.15,-4.15) 67(-11.85,-12.35) 68(-11.55,-4.15) 69(-11.25,-12.35) 70(-10.95,-4.15) 71(-10.65,-12.35) 72(-10.35,-4.15) 73(-7.65,-12.35) 74(-7.35,-4.15) 75(-7.05,-12.35) 76(-6.75,-4.15) 77(-6.45,-12.35) 78(-6.15,-4.15) 79(-5.85,-12.35) 80(-5.55,-4.15) 81(-5.25,-12.35) 82(-4.95,-4.15) 83(-4.65,-12.35) 84(-4.35,-4.15) 85(-4.05,-12.35) 86(-3.75,-4.15) 87(-3.45,-12.35) 88(-3.15,-4.15) 89(-2.85,-12.35) 90(-2.55,-4.15) 91(-2.25,-12.35) 92(-1.95,-4.15) 93(-1.65,-12.35) 94(-1.35,-4.15) 95(-1.05,-12.35) 96(-0.75,-4.15) 97(-0.45,-12.35) 98(-0.15,-4.15) 99(0.15,-12.35) 100(0.45,-4.15) 101(0.75,-12.35) 102(1.05,-4.15) 103(1.35,-12.35) 104(1.65,-4.15) 105(1.95,-12.35) 106(2.25,-4.15) 107(2.55,-12.35) 108(2.85,-4.15) 109(3.15,-12.35) 110(3.45,-4.15) 111(3.75,-12.35) 112(4.05,-4.15) 113(4.35,-12.35) 114(4.65,-4.15) 115(4.95,-12.35) 116(5.25,-4.15) 117(5.55,-12.35) 118(5.85,-4.15) 119(6.15,-12.35) 120(6.45,-4.15) 121(6.75,-12.35) 122(7.05,-4.15) 123(7.35,-12.35) 124(7.65,-4.15) 125(7.95,-12.35) 126(8.25,-4.15) 127(8.55,-12.35) 128(8.85,-4.15) 129(9.15,-12.35) 130(9.45,-4.15) 131(9.75,-12.35) 132(10.05,-4.15) 133(10.35,-12.35) 134(10.65,-4.15) 135(10.95,-12.35) 136(11.25,-4.15) 137(11.55,-12.35) 138(11.85,-4.15) 139(12.15,-12.35) 140(12.45,-4.15) 141(12.75,-12.35) 142(13.05,-4.15) 143(13.35,-12.35) 144(13.65,-4.15) 145(13.95,-12.35) 146(14.25,-4.15) 147(14.55,-12.35) 148(14.85,-4.15) 149(15.15,-12.35) 150(15.45,-4.15) 151(15.75,-12.35) 152(16.05,-4.15) 153(16.35,-12.35) 154(16.65,-4.15) 155(16.95,-12.35) 156(17.25,-4.15) 157(17.55,-12.35) 158(17.85,-4.15) 159(18.15,-12.35) 160(18.45,-4.15) 161(18.75,-12.35) 162(19.05,-4.15) 163(19.35,-12.35) 164(19.65,-4.15) 165(19.95,-12.35) 166(20.25,-4.15) 167(20.55,-12.35) 168(20.85,-4.15) 169(21.15,-12.35) 170(21.45,-4.15) 171(21.75,-12.35) 172(22.05,-4.15) 173(22.35,-12.35) 174(22.65,-4.15) 175(22.95,-12.35) 176(23.25,-4.15) 177(23.55,-12.35) 178(23.85,-4.15) 179(24.15,-12.35) 180(24.45,-4.15) 181(24.75,-12.35) 182(25.05,-4.15) 183(25.35,-12.35) 184(25.65,-4.15) 185(25.95,-12.35) 186(26.25,-4.15) 187(26.55,-12.35) 188(26.85,-4.15) 189(27.15,-12.35) 190(27.45,-4.15) 191(27.75,-12.35) 192(28.05,-4.15) 193(28.35,-12.35) 194(28.65,-4.15) 195(28.95,-12.35) 196(29.25,-4.15) 197(29.55,-12.35) 198(29.85,-4.15) 199(30.15,-12.35) 200(30.45,-4.15) 201(30.75,-12.35) 202(31.05,-4.15) 203(31.35,-12.35) 204(31.65,-4.15)
  rect 4.7x6.8 smd paste+0 mask+0: 205(-37.35,3.05) 206(37.35,3.05)
  round 1.6 hole 1.6 unplated paste-1000 mask+0: ""(-33.4,-8.25)
  round 1.1 hole 1.1 unplated paste-1000 mask+0: ""(33.4,-8.25)
Top Overlay:
  circle w0.25: c-31.625,-13.925 r0.125
  lines w0.2: -38.4,-0.725 -38.4,-13.375 -32.2,-13.375 ; -10.1,-13.375 -8.2,-13.375 ; 31.9,-13.375 38.4,-13.375 38.4,-0.725
Mechanical 10:
  lines w0.2: -39.8,-13.475 -39.8,13.475 39.8,13.475 39.8,-13.475 -39.8,-13.475
  text ".Designator" at 0,0.188 h1
Mechanical 12:
  lines w0.2: -38.4,13.375 -38.4,-13.375 38.4,-13.375 38.4,13.375
Mechanical 15:
  lines w0.1: -0.5,0 0.5,0 ; 0,-0.5 0,0.5
  lines w0.2: -39.8,-13.475 -39.8,13.475 39.8,13.475 39.8,-13.475 -39.8,-13.475
3D body "DDR3_SODIMM_RA_Socket.STEP": height 10.03, standoff -0.65, extent -38,-13.25 38,21.5

## TEXAS_DSBGA24 [mm] "YZF"
pads (24):
  round 0.255 smd paste+0 mask+0: A1(-0.75,1.25) A2(-0.25,1.25) A3(0.25,1.25) A4(0.75,1.25) B1(-0.75,0.75) B2(-0.25,0.75) B3(0.25,0.75) B4(0.75,0.75) C1(-0.75,0.25) C2(-0.25,0.25) C3(0.25,0.25) C4(0.75,0.25) D1(-0.75,-0.25) D2(-0.25,-0.25) D3(0.25,-0.25) D4(0.75,-0.25) E1(-0.75,-0.75) E2(-0.25,-0.75) E3(0.25,-0.75) E4(0.75,-0.75) F1(-0.75,-1.25) F2(-0.25,-1.25) F3(0.25,-1.25) F4(0.75,-1.25)
Top Overlay:
  circle w0.25: c-2.05,1.25 r0.125
  lines w0.2: -1.05,-1.55 -1.05,1.55 1.05,1.55 1.05,-1.55 -1.05,-1.55
Mechanical 10:
  lines w0.2: -1.55,-2.05 -1.55,2.05 1.55,2.05 1.55,-2.05 -1.55,-2.05
  text ".Designator" at 0,0.188 h1
Mechanical 12:
  lines w0.2: -1.05,-1.55 -1.05,1.55 1.05,1.55 1.05,-1.55 -1.05,-1.55
Mechanical 15:
  lines w0.1: -0.5,0 0.5,0 ; 0,-0.5 0,0.5
  lines w0.2: -1.55,-2.05 -1.55,2.05 1.55,2.05 1.55,-2.05 -1.55,-2.05
3D body "IC_Texas_Instruments_TPS62180YZFT_eec.STEP": height 0.25, standoff 0, extent -1.55,-2.05 1.55,2.05

## TEXAS_FCBGA144 [mm] "AAV"
pads (144):
  round 0.4 smd paste+0 mask+0: A1(-4.4,4.4) A2(-3.6,4.4) A3(-2.8,4.4) A4(-2,4.4) A5(-1.2,4.4) A6(-0.4,4.4) A7(0.4,4.4) A8(1.2,4.4) A9(2,4.4) A10(2.8,4.4) A11(3.6,4.4) A12(4.4,4.4) B1(-4.4,3.6) B2(-3.6,3.6) B3(-2.8,3.6) B4(-2,3.6) B5(-1.2,3.6) B6(-0.4,3.6) B7(0.4,3.6) B8(1.2,3.6) B9(2,3.6) B10(2.8,3.6) B11(3.6,3.6) B12(4.4,3.6) C1(-4.4,2.8) C2(-3.6,2.8) C3(-2.8,2.8) C4(-2,2.8) C5(-1.2,2.8) C6(-0.4,2.8) C7(0.4,2.8) C8(1.2,2.8) C9(2,2.8) C10(2.8,2.8) C11(3.6,2.8) C12(4.4,2.8) D1(-4.4,2) D2(-3.6,2) D3(-2.8,2) D4(-2,2) D5(-1.2,2) D6(-0.4,2) D7(0.4,2) D8(1.2,2) D9(2,2) D10(2.8,2) D11(3.6,2) D12(4.4,2) E1(-4.4,1.2) E2(-3.6,1.2) E3(-2.8,1.2) E4(-2,1.2) E5(-1.2,1.2) E6(-0.4,1.2) E7(0.4,1.2) E8(1.2,1.2) E9(2,1.2) E10(2.8,1.2) E11(3.6,1.2) E12(4.4,1.2) F1(-4.4,0.4) F2(-3.6,0.4) F3(-2.8,0.4) F4(-2,0.4) F5(-1.2,0.4) F6(-0.4,0.4) F7(0.4,0.4) F8(1.2,0.4) F9(2,0.4) F10(2.8,0.4) F11(3.6,0.4) F12(4.4,0.4) G1(-4.4,-0.4) G2(-3.6,-0.4) G3(-2.8,-0.4) G4(-2,-0.4) G5(-1.2,-0.4) G6(-0.4,-0.4) G7(0.4,-0.4) G8(1.2,-0.4) G9(2,-0.4) G10(2.8,-0.4) G11(3.6,-0.4) G12(4.4,-0.4) H1(-4.4,-1.2) H2(-3.6,-1.2) H3(-2.8,-1.2) H4(-2,-1.2) H5(-1.2,-1.2) H6(-0.4,-1.2) H7(0.4,-1.2) H8(1.2,-1.2) H9(2,-1.2) H10(2.8,-1.2) H11(3.6,-1.2) H12(4.4,-1.2) J1(-4.4,-2) J2(-3.6,-2) J3(-2.8,-2) J4(-2,-2) J5(-1.2,-2) J6(-0.4,-2) J7(0.4,-2) J8(1.2,-2) J9(2,-2) J10(2.8,-2) J11(3.6,-2) J12(4.4,-2) K1(-4.4,-2.8) K2(-3.6,-2.8) K3(-2.8,-2.8) K4(-2,-2.8) K5(-1.2,-2.8) K6(-0.4,-2.8) K7(0.4,-2.8) K8(1.2,-2.8) K9(2,-2.8) K10(2.8,-2.8) K11(3.6,-2.8) K12(4.4,-2.8) L1(-4.4,-3.6) L2(-3.6,-3.6) L3(-2.8,-3.6) L4(-2,-3.6) L5(-1.2,-3.6) L6(-0.4,-3.6) L7(0.4,-3.6) L8(1.2,-3.6) L9(2,-3.6) L10(2.8,-3.6) L11(3.6,-3.6) L12(4.4,-3.6) M1(-4.4,-4.4) M2(-3.6,-4.4) M3(-2.8,-4.4) M4(-2,-4.4) M5(-1.2,-4.4) M6(-0.4,-4.4) M7(0.4,-4.4) M8(1.2,-4.4) M9(2,-4.4) M10(2.8,-4.4) M11(3.6,-4.4) M12(4.4,-4.4)
Top Overlay:
  circle w0.25: c-6,4.425 r0.125
  lines w0.2: -5.075,-5.075 5.075,-5.075 5.075,5.075 -5.075,5.075 -5.075,-5.075
Mechanical 10:
  lines w0.2: -5.575,-5.575 5.575,-5.575 5.575,5.575 -5.575,5.575 -5.575,-5.575
  text ".Designator" at 0,0 h1
Mechanical 12:
  lines w0.15: -5.075,-5.075 5.075,-5.075 5.075,5.075 -5.075,5.075 -5.075,-5.075
Mechanical 15:
  lines w0.1: -0.5,0 0.5,0 ; 0,-0.5 0,0.5
  lines w0.2: -5.575,-5.575 5.575,-5.575 5.575,5.575 -5.575,5.575 -5.575,-5.575
3D body "AAV0144A.stp": height 1.77, standoff 0, extent -5,-5 5,5

## TEXAS_QFMSIA06 [mm] "Quad Flat Module"
pads (6):
  rrect10% 1x1.4 smd paste-1000 mask+0: 1(-1.85,2.54) 2(-1.85,0) 3(-1.85,-2.54) 4(1.85,-2.54) 5(1.85,0) 6(1.85,2.54)
Top Overlay:
  circle w0.25: c-3.15,3.24 r0.125
  lines w0.2: -2.55,-1.465 -2.55,-1.075 ; -2.55,1.075 -2.55,1.465 ; -0.975,-3.55 0.975,-3.55 ; -0.975,3.55 0.975,3.55 ; 2.55,-1.465 2.55,-1.075 ; 2.55,1.075 2.55,1.465
Top Paste:
  drawing of 12 lines, arcs and shapes, not listed
Mechanical 10:
  lines w0.2: -2.65,-3.65 -2.65,3.65 2.65,3.65 2.65,-3.65 -2.65,-3.65
  text ".Designator" at 0,0 h1
Mechanical 12:
  lines w0.2: -2.55,-3.55 -2.55,3.55 2.55,3.55 2.55,-3.55 -2.55,-3.55
Mechanical 15:
  lines w0.1: -0.5,0 0.5,0 ; 0,-0.5 0,0.5
  lines w0.2: -2.65,-3.65 -2.65,3.65 2.65,3.65 2.65,-3.65 -2.65,-3.65
3D body "IC_Texas_instrument_LMK61E07-SIAT_eec.STEP": height 0.25, standoff 0, extent -2.65,-3.65 2.65,3.65

## TEXAS_SOIC8D [mm] "Small Outline Integrated Circuit"
pads (8):
  rrect25% 1.97x0.6 smd: 1(-2.47,1.905) 2(-2.47,0.635) 3(-2.47,-0.635) 4(-2.47,-1.905) 5(2.47,-1.905) 6(2.47,-0.635) 7(2.47,0.635) 8(2.47,1.905)
Top Overlay:
  circle w0.2: c-4.04,2.305 r0.1
  lines w0.127: -1.947,-2.525 1.947,-2.525 ; -1.947,2.525 1.947,2.525
Mechanical 13:
  circle w0.2: c-4.04,2.305 r0.1
  lines w0.127: -1.947,-2.452 1.947,-2.452 1.947,2.452 -1.947,2.452 -1.947,-2.452
Mechanical 15:
  lines w0.05: -3.705,-2.702 3.705,-2.702 3.705,2.702 -3.705,2.702 -3.705,-2.702
3D body "SOIC8D.stp": height 1.63, standoff 0, extent -3.011,-2.451 3.011,2.451

## TEXAS_SOT223DCQ [mm] "SOT223, 6-Leads, Body 6,50x7,06mm (avg), Pitch 1,27mm, IPC Medium Density"
height 1.8
pads (6):
  rect 2.1x0.6 smd: 1(-2.975,2.54) 2(-2.975,1.27) 3(-2.975,0) 4(-2.975,-1.27) 5(-2.975,-2.54)
  rect 2.1x3.2 smd: 6(2.975,0)
Top Overlay:
  circle w0.25: c-2.975,3.39 r0.125
  lines w0.2: -1.65,-3.3 -1.65,3.3 1.65,3.3 1.65,-3.3 -1.65,-3.3
Mechanical 13:
  lines w0.1: -1.775,-3.275 -1.775,3.275 1.775,3.275 1.775,-3.275 -1.775,-3.275
Mechanical 15:
  lines w0.05: -4.25,-3.55 -4.25,3.55 4.25,3.55 4.25,-3.55 -4.25,-3.55
  lines w0.1: -0.5,0 0.5,0 ; 0,-0.5 0,0.5
3D body "SOT223DCQ.stp": height 1.66, standoff 0, extent -3.554,-3.25 3.554,3.25